# Altium footprint library standard.PcbLib: 330 footprints (part 12 of 21)
Each footprint in its own frame and in the unit in brackets; x right, y up, seen from the top. Pads: shape width x height; smd on the part's side, far side on the other; paste and mask are expansions set on the pad; w line width, h text height; cw(c..) or ccw(c..) is an arc to the next point about the centre after c.
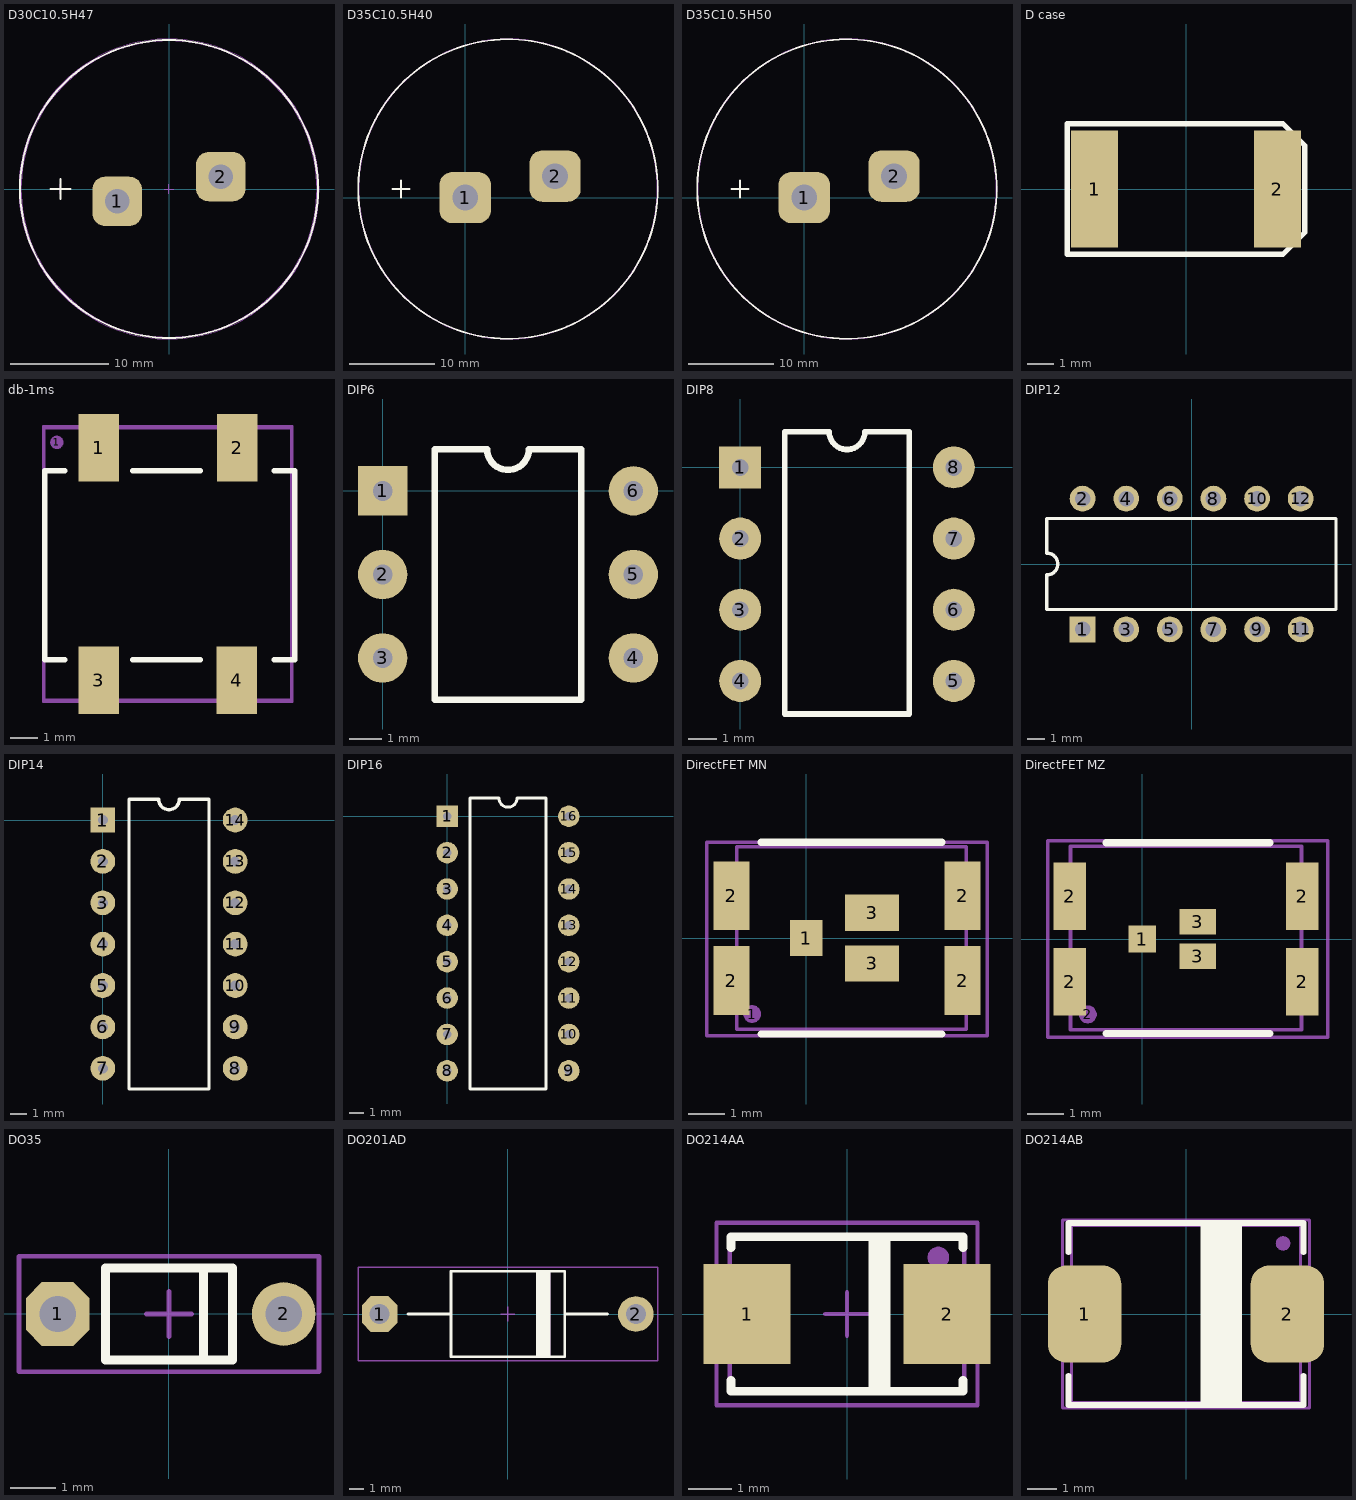
[diagram p11: the footprints below, top view; thin cyan lines are the x and y axes]

## D30C10.5H47 [mm]
height 37
pads (2):
  rrect50% 5x5 hole 2.5: 1(-5.25,-1.25) 2(5.25,1.25)
Top Overlay:
  circle w0.2: c0,0 r15.1
  lines w0.2: -12,0 -10,0 ; -11,-1 -11,1
Mechanical 1:
  circle w0.1: c0,0 r15
  lines w0.1: -11.5,0 -10.5,0 ; -11,-0.5 -11,0.5
Mechanical 15:
  circle w0.1: c0,0 r15.2
  lines w0.1: -0.5,0 0.5,0 ; 0,-0.5 0,0.5
3D body "Capacitor D30C10H47.STEP": height 47, standoff 0, extent -15,-15 15,15

## D35C10.5H40 [mm]
height 50
pads (2):
  rrect50% 6x6 hole 3: 1(0,0) 2(10.5,2.5)
Top Overlay:
  circle w0.2: c5,1 r17.5
  lines w0.2: -8.5,1 -6.5,1 ; -7.5,0 -7.5,2
Mechanical 1:
  circle w0.1: c5,1 r17.464
  lines w0.1: -8.5,1 -6.5,1 ; -7.5,0 -7.5,2
Mechanical 15:
  circle w0.1: c5,1 r17.529
3D body "Capacitor D35H40.STEP": height 40, standoff 0, extent -13,-17 23,19

## D35C10.5H50 [mm]
height 50
pads (2):
  rrect50% 6x6 hole 3: 1(0,0) 2(10.5,2.5)
Top Overlay:
  circle w0.2: c5,1 r17.5
  lines w0.2: -8.5,1 -6.5,1 ; -7.5,0 -7.5,2
Mechanical 1:
  circle w0.1: c5,1 r17.464
  lines w0.1: -8.5,1 -6.5,1 ; -7.5,0 -7.5,2
Mechanical 15:
  circle w0.1: c5,1 r17.529
3D body "User Library-el_cap_470uF-400V.STEP": height 46.7, standoff -3.5, extent -15.756,-19.756 25.756,21.756

## D case [mm]
pads (2):
  rect 1.8x4.5 smd: 1(-3.5,0) 2(3.5,0)
Top Overlay:
  lines w0.2: -4.55,-2.5 -4.55,0 -4.55,2.5 3.717,2.5 4.55,1.667 4.55,-1.667 3.717,-2.5 -4.55,-2.5
3D body "User Library-CaseD_7343-31.step": height 2.8, standoff 0, extent -3.65,-2.15 3.65,2.15

## db-1ms [mm]
pads (5):
  round 0.5 on Mech1: 1(3.2,-3.2)
  rect 1.5x2.5 smd: 1(4.75,-3.4) 2(9.875,-3.4) 3(4.75,-12) 4(9.85,-12)
Top Overlay:
  lines w0.2: 3.5,-11.25 2.75,-11.25 2.75,-4.25 3.5,-4.25 ; 6,-11.25 8.5,-11.25 ; 6,-4.25 8.5,-4.25 ; 11.25,-11.25 12,-11.25 12,-4.25 11.25,-4.25
Mechanical 1:
  lines w0.1: 2.725,-12.725 11.875,-12.725 11.875,-2.675 2.725,-2.675 2.725,-12.725
Mechanical 15:
  lines w0.1: 2.7,-12.8 2.7,-2.6 11.9,-2.6 11.9,-12.8 2.7,-12.8
3D body "User Library-DB-1S.STEP": height 3.4, standoff 0, extent 2.725,-12.725 11.875,-2.675

## DIP6 [mm]
pads (6):
  rect 1.5x1.5 hole 0.6: 1(0,0)
  round 1.5 hole 0.6: 2(0,-2.54) 3(0,-5.08) 4(7.62,-5.08) 5(7.62,-2.54) 6(7.62,0)
Top Overlay:
  lines w0.2: 1.585,-6.35 1.585,1.27 3.175,1.27 ccw(c3.81,1.27) 4.445,1.27 6.035,1.27 6.035,-6.35 1.585,-6.35

## DIP8 [mm]
pads (8):
  rect 1.5x1.5 hole 0.6: 1(0,0)
  round 1.5 hole 0.6: 2(0,-2.54) 3(0,-5.08) 4(0,-7.62) 5(7.62,-7.62) 6(7.62,-5.08) 7(7.62,-2.54) 8(7.62,0)
Top Overlay:
  lines w0.2: 1.585,-8.8 6.035,-8.8 6.035,1.27 4.445,1.27 cw(c3.81,1.27) 3.175,1.27 1.585,1.27 1.585,-8.8

## DIP12 [mm]
height 5
pads (12):
  rect 1.5x1.5 hole 0.9: 1(-6.35,-3.81)
  round 1.5 hole 0.9: 2(-6.35,3.81) 3(-3.81,-3.81) 4(-3.81,3.81) 5(-1.27,-3.81) 6(-1.27,3.81) 7(1.27,-3.81) 8(1.27,3.81) 9(3.81,-3.81) 10(3.81,3.81) 11(6.35,-3.81) 12(6.35,3.81)
Top Overlay:
  lines w0.2: -8.43,-2.65 8.41,-2.65 8.41,2.65 -8.43,2.65 -8.43,0.635 cw(c-8.43,0) -8.43,-0.635 -8.43,-2.65

## DIP14 [mm]
pads (14):
  rect 1.5x1.5 hole 0.6: 1(0,0)
  round 1.5 hole 0.6: 2(0,-2.5) 3(0,-5) 4(0,-7.5) 5(0,-10) 6(0,-12.5) 7(0,-15) 8(8,-15) 9(8,-12.5) 10(8,-10) 11(8,-7.5) 12(8,-5) 13(8,-2.5) 14(8,0)
Top Overlay:
  lines w0.2: 1.585,-16.25 1.585,1.25 3.375,1.25 ccw(c4,1.25) 4.625,1.25 6.415,1.25 6.415,-16.25 1.585,-16.25

## DIP16 [mm]
pads (16):
  rect 1.5x1.5 hole 0.6: 1(0,0)
  round 1.5 hole 0.6: 2(0,-2.54) 3(0,-5.08) 4(0,-7.62) 5(0,-10.16) 6(0,-12.7) 7(0,-15.24) 8(0,-17.78) 9(8.5,-17.78) 10(8.5,-15.24) 11(8.5,-12.7) 12(8.5,-10.16) 13(8.5,-7.62) 14(8.5,-5.08) 15(8.5,-2.54) 16(8.5,0)
Top Overlay:
  lines w0.2: 1.585,-19.05 1.585,1.27 3.615,1.27 ccw(c4.25,1.27) 4.885,1.27 6.915,1.27 6.915,-19.05 1.585,-19.05

## DirectFET MN [mm]
pads (8):
  round 0.5 on Mech1: 1(-1.5,-2.1)
  rect 0.9x1 smd: 1(0,0)
  rect 1x1.9 smd: 2(-2.075,-1.175) 2(-2.075,1.175) 2(4.325,-1.175) 2(4.325,1.175)
  rect 1.5x1 smd: 3(1.82,-0.7) 3(1.82,0.7)
Top Overlay:
  lines w0.2: -1.25,-2.65 3.75,-2.65 ; -1.25,2.65 3.75,2.65
Mechanical 1:
  lines w0.1: -1.925,-2.525 -1.925,2.525 4.425,2.525 4.425,-2.525 -1.925,-2.525
Mechanical 15:
  lines w0.1: -2.75,-2.7 -2.75,2.65 5,2.65 5,-1.5 5,-2.7 -2.75,-2.7
3D body "User Library-DirectFET_MX.STEP": height 0.75, standoff 0, extent -1.925,-2.525 4.425,2.525

## DirectFET MZ [mm]
pads (8):
  rect 0.75x0.75 smd: 1(0,0)
  rrect0% 0.9x1.85 smd: 2(-2,-1.175) 2(-2,1.175) 2(4.4,-1.175) 2(4.4,1.175)
  round 0.5 on Mech1: 2(-1.5,-2.075)
  rect 1x0.7 smd: 3(1.525,-0.475) 3(1.525,0.475)
Top Overlay:
  lines w0.2: -1,-2.6 3.5,-2.6 ; -1,2.65 3.5,2.65
Mechanical 1:
  lines w0.1: -1.975,-2.5 -1.975,2.55 4.375,2.55 4.375,-2.5 -1.975,-2.5
Mechanical 15:
  lines w0.1: -2.6,-2.7 5,-2.7 5.1,-2.7 5.1,2.7 -2.6,2.7 -2.6,-2.7
3D body "User Library-DirectFET_MX.STEP": height 0.75, standoff 0, extent -1.975,-2.5 4.375,2.55

## DO35 [mm]
height 3
pads (2):
  oct 1.4x1.4 hole 0.8: 1(-2.45,0)
  round 1.4 hole 0.8: 2(2.525,0)
Top Overlay:
  lines w0.2: 0.762,-1.016 0.762,1.016 ; -1.397,-1.016 -1.397,1.016 1.397,1.016 1.397,-1.016 -1.397,-1.016
Mechanical 1:
  lines w0.1: 0.762,-1.016 0.762,1.016 ; -1.397,-1.016 1.397,-1.016 1.397,1.016 -1.397,1.016 -1.397,-1.016
Mechanical 15:
  lines w0.1: -0.5,0 0.5,0 ; 0,-0.5 0,0.5 ; -3.302,-1.27 -3.302,1.27 3.302,1.27 3.302,-1.27 -3.302,-1.27
3D body "DO-35.step": height 2.75, standoff -1.35, extent -2.7,-0.75 2.8,0.75

## DO201AD [mm] "Diode series 1N5400-1N5408"
height 5
pads (2):
  oct 2.5x2.5 hole 1.4: 1(-9,0)
  round 2.5 hole 1.4: 2(9,0)
Top Overlay:
  region: 2,3 2,-3 3,-3 3,3
  lines w0.2: -7,0 -4,0 ; 2,3 -4,3 ; 4,0 7,0 ; -4,3 -4,-3 4,-3 4,3 -4,3
Mechanical 1:
  region: 2,3 2,-3 3,-3 3,3
  lines w0.1: -7,0 -4,0 ; 2,3 -4,3 ; 4,0 7,0 ; -4,3 4,3 4,-3 -4,-3 -4,3
Mechanical 15:
  lines w0.1: -0.5,0 0.5,0 ; 0,-0.5 0,0.5 ; -10.524,-3.302 10.558,-3.302 10.558,3.302 -10.524,3.302 -10.524,-3.302
3D body "DO-201.STEP": height 6.8, standoff -2, extent -9.647,-2.85 9.647,2.75

## DO214AA [mm] "SMB"
height 4
pads (3):
  rect 2x2.3 smd: 1(-2.3,0) 2(2.3,0)
  round 0.5 on Mech1: ""(2.1,1.3)
Top Overlay:
  rectangle: 0.5,-1.778 1,1.778
  lines w0.2: -2.667,-1.524 -2.667,-1.778 2.667,-1.778 2.667,-1.524 ; -2.667,1.524 -2.667,1.778 2.667,1.778 2.667,1.524
Mechanical 1:
  lines w0.1: -2.7,-1.8 -2.7,1.8 2.7,1.8 2.7,-1.8 -2.7,-1.8
Mechanical 15:
  lines w0.1: -0.5,0 0.5,0 ; 0,-0.5 0,0.5 ; -3,-2.1 3,-2.1 3,2.1 -3,2.1 -3,-2.1
3D body "DO-214AA SMB.STEP": height 2.3, standoff 0, extent -2.7,-1.8 2.7,1.8

## DO214AB [mm] "SMC, Body 5.9x6.9mm"
height 2.5
pads (3):
  rrect50% 2.5x3.3 smd: 1(-3.45,0) 2(3.45,0)
  round 0.5 on Mech1: ""(3.3,2.4)
Top Overlay:
  rectangle: 0.5,-3 1.9,3.1
  lines w0.2: -4,-2.1 -4,-3.1 4,-3.1 4,-2.1 ; -4,2.1 -4,3.1 4,3.1 4,2.1
Mechanical 1:
  lines w0.1: -3.9,-3 3.9,-3 3.9,3 -3.9,3 -3.9,-3
Mechanical 15:
  lines w0.1: -4.2,-3.2 4.2,-3.2 4.2,3.2 -4.2,3.2 -4.2,-3.2
3D body "DO214AB.STEP": height 2.48, standoff 0.03, extent -3.9,-2.95 3.9,2.95